# Altium footprint library ATROTECH.PcbLib: 334 footprints (part 4 of 21)
Each footprint in its own frame and in the unit in brackets; x right, y up, seen from the top. Pads: shape width x height; smd on the part's side, far side on the other; paste and mask are expansions set on the pad; w line width, h text height; cw(c..) or ccw(c..) is an arc to the next point about the centre after c.
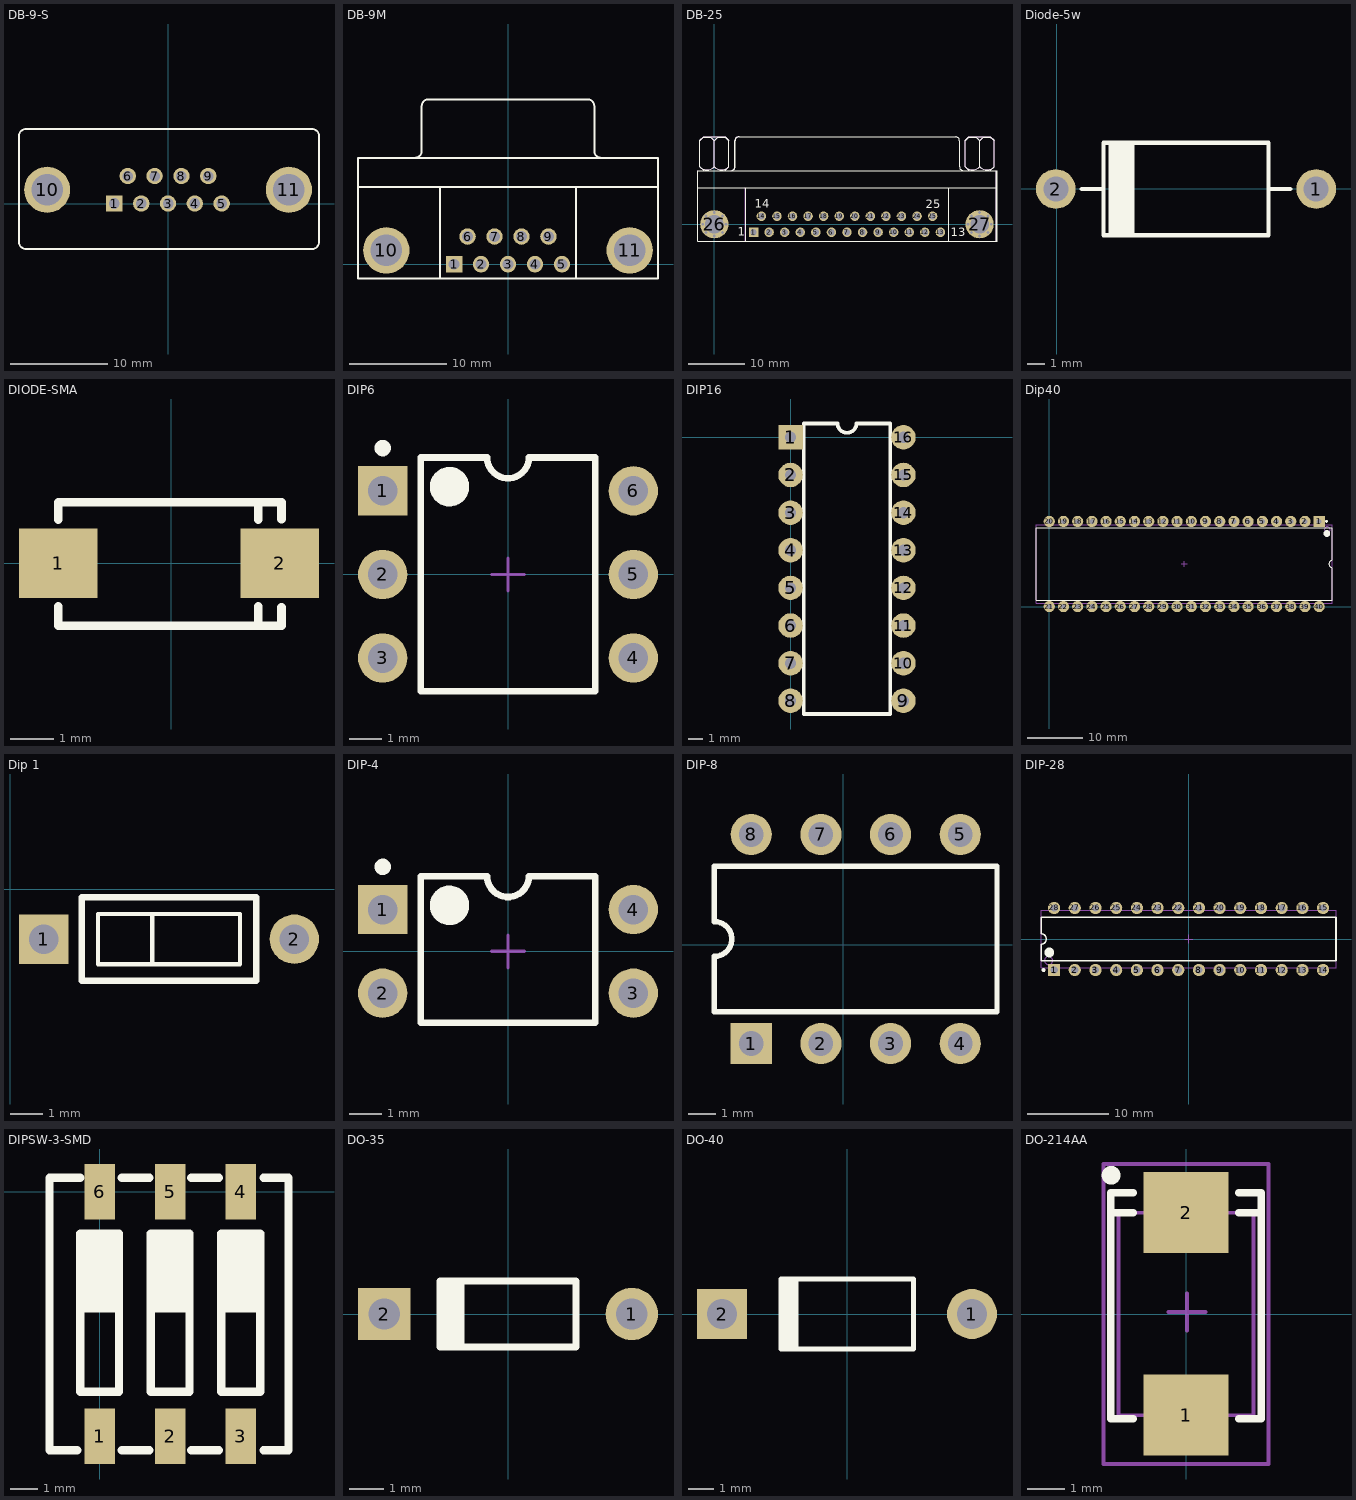
[diagram p3: the footprints below, top view; thin cyan lines are the x and y axes]

## DB-9-S [mm]
pads (11):
  rect 1.69x1.69 hole 1.09: 1(-5.54,0)
  round 1.69 hole 1.09: 2(-2.77,0) 3(0,0) 4(2.77,0) 5(5.54,0) 6(-4.155,2.84) 7(-1.385,2.84) 8(1.385,2.84) 9(4.155,2.84)
  round 4.76 hole 3.26: 10(-12.495,1.42) 11(12.495,1.42)
Top Overlay:
  lines w0.2: -15.4,-4.005 -15.4,7.005 ; -15.395,-4.005 ccw(c-14.7,-4.005) -14.7,-4.7 14.905,-4.7 ; -15.395,7.005 cw(c-14.7,7.005) -14.7,7.7 14.9,7.7 cw(c14.9,7.005) 15.595,7.005 ; 14.905,-4.695 ccw(c14.905,-4) 15.6,-4 15.6,7.005
3D body "User Library-con-116-1.step": height 11.8, standoff -5.1, extent -15.399,-4.7 15.6,7.7

## DB-9M [mm]
pads (11):
  rect 1.69x1.69 hole 1.09: 1(-5.54,0)
  round 1.69 hole 1.09: 2(-2.77,0) 3(0,0) 4(2.77,0) 5(5.54,0) 6(-4.155,2.84) 7(-1.385,2.84) 8(1.385,2.84) 9(4.155,2.84)
  round 4.76 hole 3.26: 10(-12.495,1.42) 11(12.495,1.42)
Top Overlay:
  lines w0.2: -15.4,7.92 15.4,7.92 ; -9.56,10.925 ccw(c-9.56,11.62) -8.865,11.62 -8.865,16.22 ; -8.86,16.225 cw(c-8.165,16.225) -8.165,16.92 8.165,16.92 cw(c8.165,16.225) 8.86,16.225 ; -7,-1.48 -7,7.92 ; 7,-1.48 7,7.92 ; 8.865,16.22 8.865,11.62 ccw(c9.56,11.62) 9.56,10.925 ; -15.4,-1.48 -15.4,10.92 15.4,10.92 15.4,-1.48 -15.4,-1.48
3D body "User Library-DB9-Usa.step": height 12.27, standoff -4.6, extent -15.41,-1.45 15.4,16.85

## DB-25 [mm]
pads (43):
  rect 1.69x1.69 hole 1.09: 1(6.96,-1.42)
  round 1.69 hole 1.09: 2(9.721,-1.42) 3(12.482,-1.42) 4(15.243,-1.42) 5(18.004,-1.42) 6(20.765,-1.42) 7(23.526,-1.42) 8(26.287,-1.42) 9(29.048,-1.42) 10(31.809,-1.42) 11(34.57,-1.42) 12(37.331,-1.42) 13(40.092,-1.42) 14(8.34,1.42) 15(11.101,1.42) 16(13.862,1.42) 17(16.623,1.42) 18(19.384,1.42) 19(22.145,1.42) 20(24.906,1.42) 21(27.667,1.42) 22(30.428,1.42) 23(33.189,1.42) 24(35.95,1.42) 25(38.711,1.42)
  round 0.8 hole 0.5: 26(-2.06,0) 26(-1.457,-1.457) 26(-1.457,1.457) 26(0,-2.06) 26(0,2.06) 26(1.457,-1.457) 26(1.457,1.457) 26(2.06,0) 27(44.992,0) 27(45.595,-1.457) 27(45.595,1.457) 27(47.052,-2.06) 27(47.052,2.06) 27(48.509,-1.457) 27(48.509,1.457) 27(49.112,0)
  round 5 hole 3.26: 26(0,0) 27(47.052,0)
Top Overlay:
  lines w0.2: -2.97,6.5 50.13,6.5 ; -2.543,14.85 -2.543,10.199 -1.908,9.564 ; -2.543,14.865 -1.908,15.5 1.902,15.5 2.537,14.865 ; -0.003,10.199 -0.003,14.85 ; 1.902,9.564 2.537,10.199 2.537,14.85 ; 2.537,13.586 2.537,13.798 ; 2.935,9.505 ccw(c2.935,10.2) 3.63,10.2 3.63,14.8 ; 2.985,9.505 ccw(c2.985,10.2) 3.68,10.2 3.68,14.8 ; 3.635,14.805 cw(c4.33,14.805) 4.33,15.5 ; 3.685,14.805 cw(c4.38,14.805) 4.38,15.5 42.78,15.5 cw(c42.78,14.805) 43.475,14.805 ; 5.58,-3 5.58,6.5 ; 41.58,-3 41.58,6.5 ; 43.48,14.8 43.48,10.2 ccw(c44.175,10.2) 44.175,9.505 ; 44.519,14.85 44.519,10.199 45.154,9.564 ; 44.519,14.865 45.154,15.5 48.964,15.5 49.599,14.865 ; 47.059,10.199 47.059,14.85 ; 48.964,9.564 49.599,10.199 49.599,14.85 ; 49.599,13.586 49.599,13.798 ; 49.957,-2.9 49.957,9.5 ; -2.97,-3 -2.97,9.5 50.13,9.5 50.13,-3 -2.97,-3
  lines w0.203: -2.545,10.197 ccw(c-1.273,11.469) -0.001,10.197 ; -2.543,14.85 cw(c-1.271,13.578) 0.002,14.85 ; -0.007,14.85 cw(c1.265,13.578) 2.537,14.85 ; -0.005,10.197 ccw(c1.267,11.469) 2.539,10.197 ; 44.517,10.197 ccw(c45.789,11.469) 47.061,10.197 ; 44.519,14.85 cw(c45.791,13.578) 47.064,14.85 ; 47.055,14.85 cw(c48.327,13.578) 49.599,14.85 ; 47.057,10.197 ccw(c48.329,11.469) 49.601,10.197
  text "1" at 4.161,-2.06 h1.5
  text "25" at 37.5,2.8 h1.5
  text "14" at 7.2,2.9 h1.5
  text "13" at 41.9,-2.1 h1.5
Mechanical 1:
  lines w0.1: 2.935,9.505 ccw(c2.935,10.2) 3.63,10.2 ; 3.635,14.805 cw(c4.33,14.805) 4.33,15.5
Mechanical 13:
  lines w0.1: -2.905,-2.9 -2.905,9.5 ; -2.545,10.197 ccw(c-1.273,11.469) -0.001,10.197 ; -2.543,14.865 -1.908,15.5 1.902,15.5 2.537,14.865 ; -1.908,9.564 -2.543,10.199 -2.543,14.85 cw(c-1.271,13.578) 0.002,14.85 ; -0.007,14.85 cw(c1.265,13.578) 2.537,14.85 2.537,10.199 1.902,9.564 ; -0.005,10.197 ccw(c1.267,11.469) 2.539,10.197 ; -0.003,10.199 -0.003,14.85 ; 2.537,13.586 2.537,13.798 ; 3.63,10.2 3.63,14.8 ; 5.495,-2.9 5.495,6.5 ; 44.517,10.197 ccw(c45.789,11.469) 47.061,10.197 ; 44.519,14.865 45.154,15.5 48.964,15.5 49.599,14.865 ; 45.154,9.564 44.519,10.199 44.519,14.85 cw(c45.791,13.578) 47.064,14.85 ; 47.055,14.85 cw(c48.327,13.578) 49.599,14.85 49.599,10.199 48.964,9.564 ; 47.057,10.197 ccw(c48.329,11.469) 49.601,10.197 ; 47.059,10.199 47.059,14.85 ; 49.599,13.586 49.599,13.798 ; 49.957,-2.9 49.957,9.5
3D body "User Library-D-sub DB-25FB.STEP": height 12.5, standoff -4.66, extent -2.95,-2.862 50.15,15.542

## Diode-5w [mil]
pads (2):
  round 90 hole 57: 1(588,-1) 2(-2,-1)
Top Overlay:
  region: 117.8,-106 117.8,104 175.28,104 175.28,-106
  lines w10: 56.78,-1 106,-1 ; 480,-1 529.22,-1 ; 106,-106 106,104 480,104 480,-106 106,-106
3D body "BYW98.STEP": height 254.33, standoff -86.22, extent -28.26,-104.15 613.47,104.51

## DIODE-SMA [mm]
pads (2):
  rect 1.8x1.6 smd: 1(-2.6,0) 2(2.5,0)
Top Overlay:
  lines w0.2: -2.6,-1 -2.6,-1.444 2.446,-1.444 ; -2.6,1 -2.6,1.396 2.398,1.396 ; 2,-1 2,-1.444 2.537,-1.444 2.537,-1.013 ; 2,1.004 2,1.4 2.539,1.4 2.539,1.015
3D body "Diode SMA.stp": height 2.41, standoff 0, extent -2.653,-1.46 2.626,1.46

## DIP6 [mm]
pads (6):
  rect 1.5x1.5 hole 0.9: 1(-3.81,2.54)
  round 1.5 hole 0.9: 2(-3.81,0) 3(-3.81,-2.54) 4(3.81,-2.54) 5(3.81,0) 6(3.81,2.54)
Top Overlay:
  circle w0.6: c-1.778,2.667 r0.3
  circle w0.25: c-3.81,3.84 r0.125
  lines w0.2: -2.65,-3.556 2.65,-3.556 2.65,3.556 0.635,3.556 cw(c0,3.556) -0.635,3.556 -2.65,3.556 -2.65,-3.556
Mechanical 15:
  lines w0.1: -0.5,0 0.5,0 ; 0,-0.5 0,0.5
3D body "User Library-DIP6.STEP": height 5.3, standoff -2, extent -3.806,-3.56 4.064,3.56

## DIP16 [mil]
pads (16):
  rect 65x65 hole 30: 1(0,0)
  round 65 hole 30: 2(0,-100) 3(0,-200) 4(0,-300) 5(0,-400) 6(0,-500) 7(0,-600) 8(0,-700) 9(300,-700) 10(300,-600) 11(300,-500) 12(300,-400) 13(300,-300) 14(300,-200) 15(300,-100) 16(300,0)
Top Overlay:
  lines w10: 35,-735 35,37 125,37 ccw(c150,37) 175,37 265,37 265,-735 35,-735
3D body "SW3dPS-DIP16-300.step": height 200, standoff -98.03, extent -4.92,-743.7 304.92,43.7

## Dip40 [mm] "40pin Dip IC"
pads (40):
  rect 2x2 hole 0.9: 1(48.26,15.24)
  round 2 hole 0.9: 2(45.72,15.24) 3(43.18,15.24) 4(40.64,15.24) 5(38.1,15.24) 6(35.56,15.24) 7(33.02,15.24) 8(30.48,15.24) 9(27.94,15.24) 10(25.4,15.24) 11(22.86,15.24) 12(20.32,15.24) 13(17.78,15.24) 14(15.24,15.24) 15(12.7,15.24) 16(10.16,15.24) 17(7.62,15.24) 18(5.08,15.24) 19(2.54,15.24) 20(0,15.24) 21(0,0) 22(2.54,0) 23(5.08,0) 24(7.62,0) 25(10.16,0) 26(12.7,0) 27(15.24,0) 28(17.78,0) 29(20.32,0) 30(22.86,0) 31(25.4,0) 32(27.94,0) 33(30.48,0) 34(33.02,0) 35(35.56,0) 36(38.1,0) 37(40.64,0) 38(43.18,0) 39(45.72,0) 40(48.26,0)
Top Overlay:
  circle w0.6: c49.63,13.07 r0.3
  circle w0.25: c49.56,15.24 r0.125
  lines w0.2: -2.37,1.17 -2.37,14.07 50.63,14.07 50.63,8.255 ccw(c50.63,7.62) 50.63,6.985 50.63,1.17 -2.37,1.17
Mechanical 13:
  circle w0.1: c49.705,13.77 r0.5
  lines w0.1: -2.345,0.57 50.605,0.57 50.605,14.67 -2.345,14.67 -2.345,0.57
Mechanical 15:
  lines w0.1: 23.63,7.62 24.63,7.62 ; 24.13,7.12 24.13,8.12

## Dip 1 [mm]
pads (2):
  rect 1.5x1.5 hole 0.9: 1(1.016,-1.524)
  round 1.5 hole 0.9: 2(8.636,-1.524)
Top Overlay:
  lines w0.127: 4.318,-2.286 4.318,-0.762 ; 2.667,-2.286 6.985,-2.286 6.985,-0.762 2.667,-0.762 2.667,-2.286
  lines w0.2: 5.461,-0.244 7.476,-0.244 7.476,-2.794 2.176,-2.794 2.176,-0.244 5.588,-0.244

## DIP-4 [mm]
pads (4):
  rect 1.5x1.5 hole 0.9: 1(-3.81,1.27)
  round 1.5 hole 0.9: 2(-3.81,-1.27) 3(3.81,-1.27) 4(3.81,1.27)
Top Overlay:
  circle w0.6: c-1.778,1.397 r0.3
  circle w0.25: c-3.81,2.57 r0.125
  lines w0.2: -2.65,-2.17 2.65,-2.17 2.65,2.286 0.635,2.286 cw(c0,2.286) -0.635,2.286 -2.65,2.286 -2.65,-2.17
Mechanical 15:
  lines w0.1: -0.5,0 0.5,0 ; 0,-0.5 0,0.5
3D body "CircuitWorks-DIP4.step": height 4.31, standoff -3.28, extent -3.9,-2.71 4.1,2.83

## DIP-8 [mm]
pads (8):
  rect 1.5x1.5 hole 0.9: 1(-3.353,-3.607)
  round 1.5 hole 0.9: 2(-0.813,-3.607) 3(1.727,-3.607) 4(4.267,-3.607) 5(4.267,4.013) 6(1.727,4.013) 7(-0.813,4.013) 8(-3.353,4.013)
Top Overlay:
  lines w0.2: -4.693,-2.447 5.607,-2.447 5.607,2.853 -4.693,2.853 -4.693,0.838 cw(c-4.693,0.203) -4.693,-0.432 -4.693,-2.447
3D body "DIP8N.STEP": height 3.59, standoff -3.26, extent -4.267,-4.086 5.233,4.441

## DIP-28 [mm]
pads (28):
  rect 1.5x1.5 hole 0.9: 1(-16.51,-3.785)
  round 1.5 hole 0.9: 2(-13.97,-3.785) 3(-11.43,-3.785) 4(-8.89,-3.785) 5(-6.35,-3.785) 6(-3.81,-3.785) 7(-1.27,-3.785) 8(1.27,-3.785) 9(3.81,-3.785) 10(6.35,-3.785) 11(8.89,-3.785) 12(11.43,-3.785) 13(13.97,-3.785) 14(16.51,-3.785) 15(16.51,3.835) 16(13.97,3.835) 17(11.43,3.835) 18(8.89,3.835) 19(6.35,3.835) 20(3.81,3.835) 21(1.27,3.835) 22(-1.27,3.835) 23(-3.81,3.835) 24(-6.35,3.835) 25(-8.89,3.835) 26(-11.43,3.835) 27(-13.97,3.835) 28(-16.51,3.835)
Top Overlay:
  circle w0.6: c-17.1,-1.625 r0.3
  circle w0.25: c-17.81,-3.785 r0.125
  lines w0.2: -18.1,-2.625 -18.1,-0.61 ccw(c-18.1,0.025) -18.1,0.66 -18.1,2.675 18.1,2.675 18.1,-2.625 -18.1,-2.625
Mechanical 13:
  circle w0.1: c-17.2,-2.625 r0.5
  lines w0.1: -18.1,-3.525 -18.1,3.575 18.1,3.575 18.1,-3.525 -18.1,-3.525
Mechanical 15:
  lines w0.1: -0.5,0.025 0.5,0.025 ; 0,-0.475 0,0.525
3D body "Atmega328.STEP": height 7.98, standoff 0, extent -17.749,-5.201 17.851,4.999

## DIPSW-3-SMD [mm]
pads (6):
  rect 1.1x2 smd: 1(0,-8.8) 2(2.54,-8.8) 3(5.08,-8.8) 4(5.08,0) 5(2.54,0) 6(0,0)
Top Overlay:
  rectangle: 4.38,-4.35 5.78,-1.5
  rectangle: 1.84,-4.35 3.24,-1.5
  rectangle: -0.7,-4.35 0.7,-1.5
  lines w0.3: -0.8,-9.3 -1.8,-9.3 -1.8,0.5 -0.7,0.5 ; -0.7,-3.5 0.7,-3.5 ; 0.8,-9.3 1.8,-9.3 ; 0.8,0.5 1.8,0.5 ; 1.84,-3.5 3.24,-3.5 ; 3.3,-9.3 4.3,-9.3 ; 3.3,0.5 4.3,0.5 ; 4.38,-3.5 5.78,-3.5 ; 5.9,-9.3 6.8,-9.3 6.8,0.5 5.9,0.5 ; -0.7,-7.2 0.7,-7.2 0.7,-1.5 -0.7,-1.5 -0.7,-7.2 ; 1.84,-7.2 1.84,-1.5 3.24,-1.5 3.24,-7.2 1.84,-7.2 ; 4.38,-7.2 4.38,-1.5 5.78,-1.5 5.78,-7.2 4.38,-7.2
3D body "User Library-DM04V.STEP": height 4.47, standoff -0.05, extent -1.75,-9.29 6.799,0.49

## DO-35 [mm]
pads (2):
  round 1.5 hole 0.9: 1(3.55,0)
  rect 1.5x1.5 hole 0.9: 2(-3.55,0)
Top Overlay:
  region: -1.25,0.95 -2.05,0.95 -2.05,-0.95 -1.25,-0.95
  lines w0.2: -1.95,-0.95 1.95,-0.95 1.95,0.95 -1.95,0.95
3D body "SW3dPS-do_35.STEP": height 1.89, standoff -2.29, extent -3.816,-0.875 3.816,0.875

## DO-40 [mm]
pads (2):
  round 2 hole 1.2: 1(5,0)
  rect 2x2 hole 1.2: 2(-5,0)
Top Overlay:
  region: -1.95,1.4 -2.75,1.4 -2.75,-1.4 -1.95,-1.4
  lines w0.2: -2.65,-1.4 2.65,-1.4 2.65,1.4 -2.65,1.4
3D body "DO_41_10mmPitch.step": height 2.8, standoff -2.4, extent -5.35,-1.3 5.35,1.304

## DO-214AA [mm]
pads (2):
  rect 2.26x2.16 smd: 1(0,-2.7) 2(0,2.7)
Top Overlay:
  circle w0.25: c-2,3.7 r0.125
  lines w0.2: -1.4,-2.8 -2,-2.8 -2,2.7 ; -1.4,2.7 -2,2.7 ; -1.4,3.237 -2,3.237 -2,2.7 ; 1.4,-2.8 2,-2.8 2,2.7 ; 1.4,2.7 2,2.7 ; 1.4,3.237 2,3.237 2,2.7
Mechanical 13:
  lines w0.1: -1.8,-2.7 -1.8,2.701 1.8,2.701 1.8,-2.7 -1.8,-2.7
Mechanical 15:
  lines w0.1: -0.474,0.051 0.526,0.051 ; 0.026,-0.449 0.026,0.551 ; -2.2,-4 -2.2,4 2.2,4 2.2,-4 -2.2,-4
3D body "User Library-DO-214AA SMB.step": height 2.3, standoff 0, extent -1.8,-2.7 1.8,2.7